# Altium footprint library digital.PcbLib: 46 footprints (part 2 of 3)
Each footprint in its own frame and in the unit in brackets; x right, y up, seen from the top. Pads: shape width x height; smd on the part's side, far side on the other; paste and mask are expansions set on the pad; w line width, h text height; cw(c..) or ccw(c..) is an arc to the next point about the centre after c.
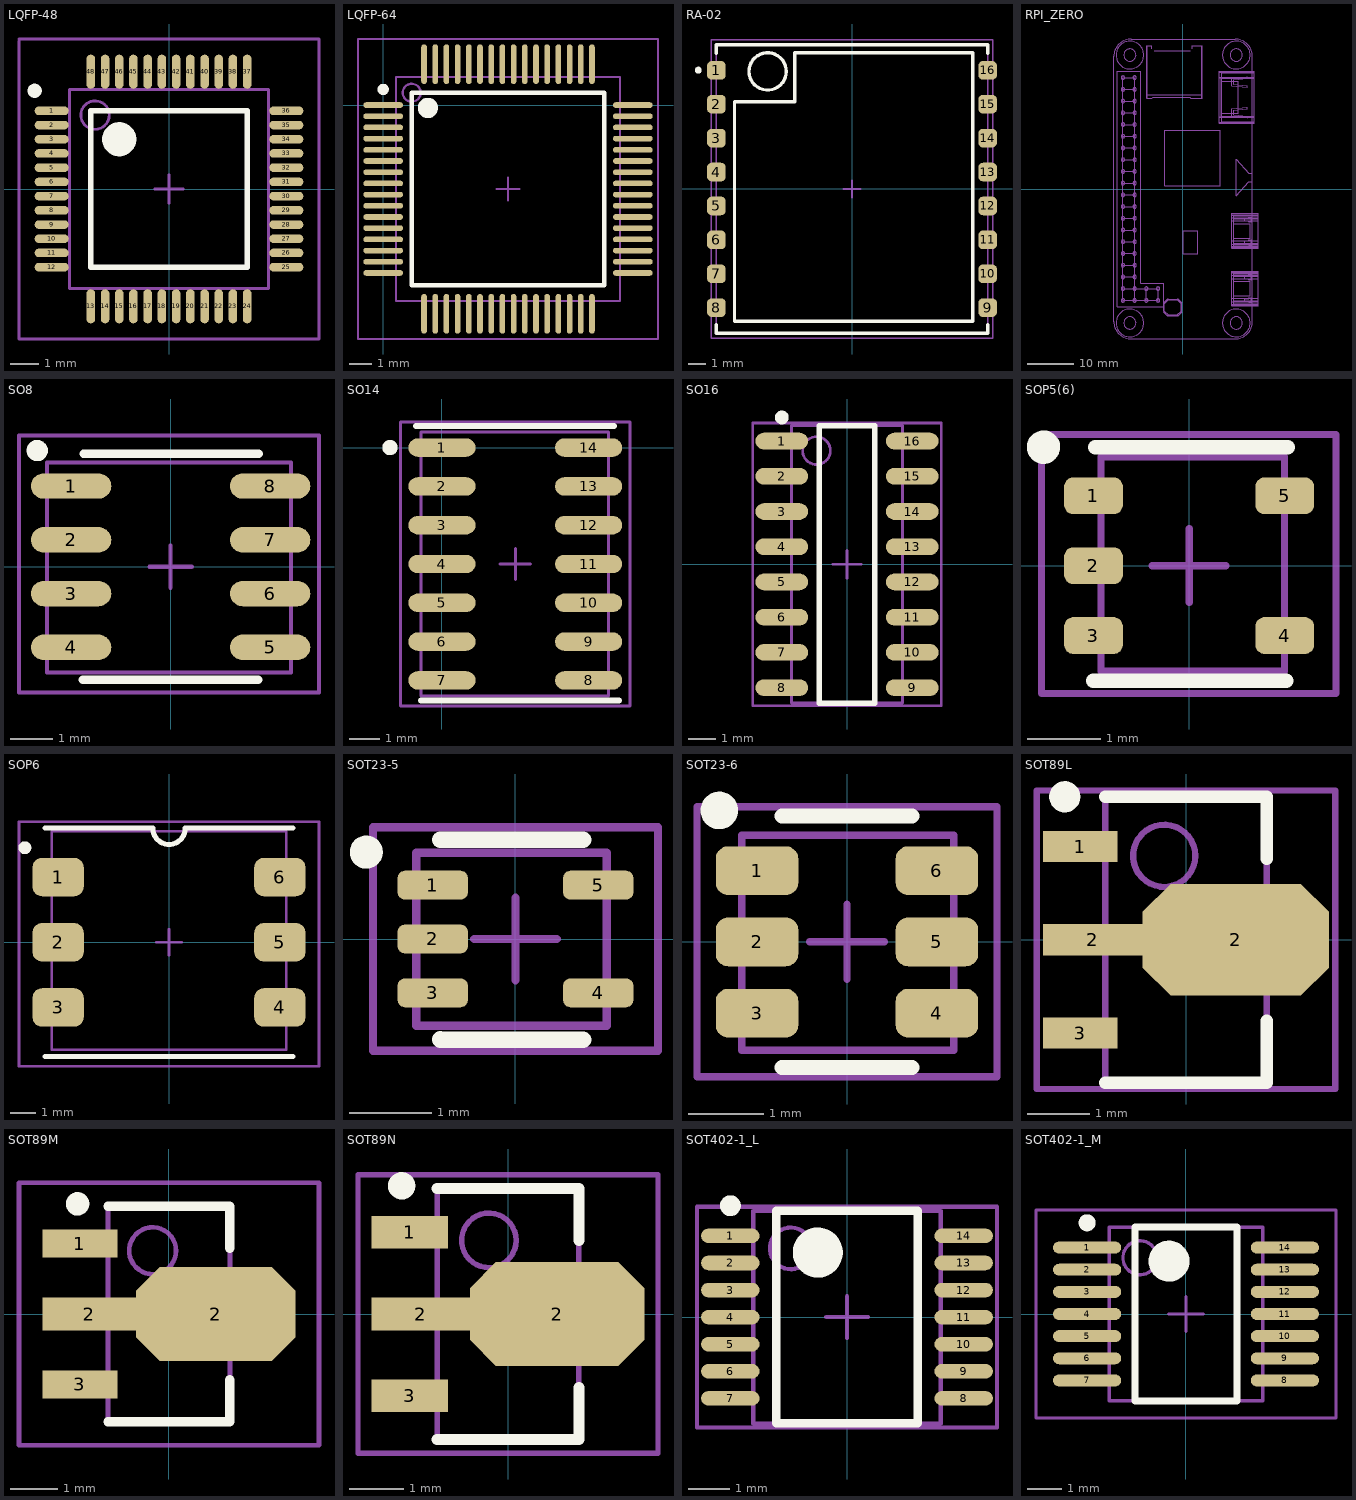
[diagram p1: the footprints below, top view; thin cyan lines are the x and y axes]

## LQFP-48 [mm] "Thin QFP, 48-Leads, Body 7x7mm, Pitch 0.5mm, IPC Medium Density"
height 1.6
pads (48):
  oval 1.2x0.3 smd: 1(-4.126,2.75) 2(-4.126,2.25) 3(-4.126,1.75) 4(-4.126,1.25) 5(-4.126,0.75) 6(-4.126,0.25) 7(-4.126,-0.25) 8(-4.126,-0.75) 9(-4.126,-1.25) 10(-4.126,-1.75) 11(-4.126,-2.25) 12(-4.126,-2.75) 25(4.126,-2.75) 26(4.126,-2.25) 27(4.126,-1.75) 28(4.126,-1.25) 29(4.126,-0.75) 30(4.126,-0.25) 31(4.126,0.25) 32(4.126,0.75) 33(4.126,1.25) 34(4.126,1.75) 35(4.126,2.25) 36(4.126,2.75)
  oval 0.3x1.2 smd: 13(-2.75,-4.126) 14(-2.25,-4.126) 15(-1.75,-4.126) 16(-1.25,-4.126) 17(-0.75,-4.126) 18(-0.25,-4.126) 19(0.25,-4.126) 20(0.75,-4.126) 21(1.25,-4.126) 22(1.75,-4.126) 23(2.25,-4.126) 24(2.75,-4.126) 37(2.75,4.126) 38(2.25,4.126) 39(1.75,4.126) 40(1.25,4.126) 41(0.75,4.126) 42(0.25,4.126) 43(-0.25,4.126) 44(-0.75,4.126) 45(-1.25,4.126) 46(-1.75,4.126) 47(-2.25,4.126) 48(-2.75,4.126)
Top Overlay:
  circle w0.25: c-4.724,3.454 r0.125
  circle w0.6: c-1.75,1.75 r0.3
  lines w0.2: -2.75,-2.75 -2.75,2.75 2.75,2.75 2.75,-2.75 -2.75,-2.75
Mechanical 13:
  circle w0.1: c-2.6,2.6 r0.5
  lines w0.1: -3.5,-3.5 -3.5,3.5 3.5,3.5 3.5,-3.5 -3.5,-3.5
  text ".Designator" at -1.753,4.089 h0.5
  text ".Value" at -1.016,-0.178 h0.5
Mechanical 15:
  lines w0.1: -5.276,5.2 -5.276,-5.276 5.276,-5.276 5.276,5.276 -5.276,5.276 ; -0.5,0 0.5,0 ; 0,-0.5 0,0.5
3D body "User Library-LQFP48_Grid_0_5.STEP": height 1.6, standoff 0, extent -4.5,-4.5 4.5,4.5

## LQFP-64 [mm] "64-Pin LQFP 0.5 mm Pitch"
height 1.6
pads (64):
  oval 1.778x0.25 smd mask+0.076: 1(0,0) 2(0,-0.5) 3(0,-1) 4(0,-1.5) 5(0,-2) 6(0,-2.5) 7(0,-3) 8(0,-3.5) 9(0,-4) 10(0,-4.5) 11(0,-5) 12(0,-5.5) 13(0,-6) 14(0,-6.5) 15(0,-7) 16(0,-7.5) 33(11.15,-7.5) 34(11.15,-7) 35(11.15,-6.5) 36(11.15,-6) 37(11.15,-5.5) 38(11.15,-5) 39(11.15,-4.5) 40(11.15,-4) 41(11.15,-3.5) 42(11.15,-3) 43(11.15,-2.5) 44(11.15,-2) 45(11.15,-1.5) 46(11.15,-1) 47(11.15,-0.5) 48(11.15,0)
  oval 0.25x1.778 smd mask+0.076: 17(1.825,-9.325) 18(2.325,-9.325) 19(2.825,-9.325) 20(3.325,-9.325) 21(3.825,-9.325) 22(4.325,-9.325) 23(4.825,-9.325) 24(5.325,-9.325) 25(5.825,-9.325) 26(6.325,-9.325) 27(6.825,-9.325) 28(7.325,-9.325) 29(7.825,-9.325) 30(8.325,-9.325) 31(8.825,-9.325) 32(9.325,-9.325) 49(9.325,1.825) 50(8.825,1.825) 51(8.325,1.825) 52(7.825,1.825) 53(7.325,1.825) 54(6.825,1.825) 55(6.325,1.825) 56(5.825,1.825) 57(5.325,1.825) 58(4.825,1.825) 59(4.325,1.825) 60(3.825,1.825) 61(3.325,1.825) 62(2.825,1.825) 63(2.325,1.825) 64(1.825,1.825)
Top Overlay:
  circle w0.6: c1.995,-0.13 r0.15
  circle w0.25: c0,0.7 r0.125
  lines w0.2: 1.275,-8.05 9.875,-8.05 9.875,0.55 1.275,0.55 1.275,-8.05
Mechanical 13:
  circle w0.1: c1.275,0.55 r0.4
  lines w0.1: 0.575,-8.75 10.575,-8.75 10.575,1.25 0.575,1.25 0.575,-8.75
  text ".Value" at 4.597,-4.039 h0.5
  text ".Designator" at 3.734,1.6 h0.5
Mechanical 15:
  lines w0.1: 5.075,-3.75 6.075,-3.75 ; 5.575,-4.25 5.575,-3.25 ; -1.125,-10.45 12.275,-10.45 12.275,2.95 -1.125,2.95 -1.125,-10.45
3D body "User Library-lqpf64.step": height 1.5, standoff 0.02, extent -0.425,-9.75 11.575,2.25

## RA-02 [mm]
height 4
pads (16):
  rrect50% 1.1x1.1 smd: 1(-8,7) 2(-8,5) 3(-8,3) 4(-8,1) 5(-8,-1) 6(-8,-3) 7(-8,-5) 8(-8,-7) 9(8,-7) 10(8,-5) 11(8,-3) 12(8,-1) 13(8,1) 14(8,3) 15(8,5) 16(8,7)
Top Overlay:
  circle w0.254: c-9.068,7.01 r0.076
  circle w0.2: c-4.978,6.934 r1.1
  lines w0.2: -8.001,-8.001 -8.001,-8.509 8.001,-8.509 8.001,-8.001 ; -8.001,8.001 -8.001,8.509 8.001,8.509 8.001,8.001 ; -6.934,-7.798 7.112,-7.798 7.112,8.026 -3.378,8.026 -3.378,5.156 -6.934,5.156 -6.934,-7.798
Mechanical 13:
  circle w0.1: c-4.978,6.934 r1.1
  lines w0.1: -8,-8.5 8,-8.5 8,8.5 -8,8.5 -8,-8.5 ; -6.934,-7.798 -6.934,5.156 -3.378,5.156 -3.378,8.026 7.112,8.026 7.112,-7.798 -6.934,-7.798
  text ".Designator" at -7.592,8.871 h0.5
  text ".Value" at -0.965,-0.178 h0.5
Mechanical 15:
  lines w0.1: -0.5,0 0.5,0 ; 0,-0.5 0,0.5 ; -8.3,-8.8 8.3,-8.8 8.3,8.8 -8.3,8.8 -8.3,-8.8
3D body "User Library-RA-02.step": height -0.5, standoff -3.7, extent -8,-8.5 8,8.5

## RPI_ZERO [mm]
height 6
Mechanical 1:
  drawing of 375 lines, arcs and shapes, not listed
3D body "raspberry_pi_zero.STEP": height 14.1, standoff 2.5, extent -14.973,-32.474 15.652,32.525

## SO8 [mm]
pads (8):
  oval 1.9x0.6 smd: 1(-2.35,1.905) 2(-2.35,0.635) 3(-2.35,-0.635) 4(-2.35,-1.905) 5(2.35,-1.905) 6(2.35,-0.635) 7(2.35,0.635) 8(2.35,1.905)
Top Overlay:
  circle w0.25: c-3.15,2.743 r0.125
  lines w0.2: -2.07,-2.667 2.07,-2.667 ; -2.057,2.667 2.083,2.667
Mechanical 13:
  lines w0.1: -2.921,-2.5 2.845,-2.5 2.845,2.464 -2.921,2.464 -2.921,-2.5
  text ".Value" at -1.041,-0.229 h0.5
  text ".Designator" at -1.829,2.972 h0.5
Mechanical 15:
  lines w0.1: -0.5,0 0.5,0 ; 0,-0.5 0,0.5 ; -3.581,-2.972 3.505,-2.972 3.505,3.099 -3.581,3.099 -3.581,-2.972
3D body "CircuitWorks-SO-8.step": height 1.45, standoff 0, extent -2.908,-2.451 2.87,2.451

## SO14 [mm] "14-Pin Small Outline Integrated Circuit 1.27 mm Pitch, IPC Medium Density"
height 1.75
pads (14):
  oval 2.2x0.6 smd: 1(0,0) 2(0,-1.27) 3(0,-2.54) 4(0,-3.81) 5(0,-5.08) 6(0,-6.35) 7(0,-7.62) 8(4.8,-7.62) 9(4.8,-6.35) 10(4.8,-5.08) 11(4.8,-3.81) 12(4.8,-2.54) 13(4.8,-1.27) 14(4.8,0)
Top Overlay:
  circle w0.25: c-1.702,0 r0.125
  lines w0.2: -0.851,0.711 5.626,0.711 ; -0.686,-8.28 5.791,-8.28
Mechanical 13:
  lines w0.1: -0.681,-8.135 5.456,-8.135 5.456,0.515 -0.681,0.515 -0.681,-8.135
  text ".Designator" at 0.66,0.914 h0.5
  text ".Value" at 1.5,-3.962 h0.5
Mechanical 15:
  lines w0.1: 1.9,-3.81 2.9,-3.81 ; 2.4,-4.31 2.4,-3.31 ; -1.35,-8.46 6.15,-8.46 6.15,0.84 -1.35,0.84 -1.35,-8.46
3D body "User Library-so14-2.step": height 1.78, standoff 0.01, extent -0.681,-8.16 5.456,0.54

## SO16 [mm] "SOIC, 16-Leads, Body 9.9x3.9mm, Pitch 1.27mm, IPC High Density"
height 1.75
pads (16):
  oval 1.9x0.6 smd: 1(-2.35,4.445) 2(-2.35,3.175) 3(-2.35,1.905) 4(-2.35,0.635) 5(-2.35,-0.635) 6(-2.35,-1.905) 7(-2.35,-3.175) 8(-2.35,-4.445) 9(2.35,-4.445) 10(2.35,-3.175) 11(2.35,-1.905) 12(2.35,-0.635) 13(2.35,0.635) 14(2.35,1.905) 15(2.35,3.175) 16(2.35,4.445)
Top Overlay:
  circle w0.25: c-2.35,5.295 r0.125
  lines w0.2: -1,-5 -1,5 1,5 1,-5 -1,-5
Mechanical 13:
  circle w0.1: c-1.1,4.1 r0.5
  lines w0.1: -2,-5 -2,5 2,5 2,-5 -2,-5
  text ".Value" at -0.965,-0.203 h0.5
  text ".Designator" at -1.829,5.232 h0.5
Mechanical 15:
  lines w0.1: -0.5,0 0.5,0 ; 0,-0.5 0,0.5 ; -3.4,-5.1 -3.4,5.1 3.4,5.1 3.4,-5.1 -3.4,-5.1
3D body: height 1.75, standoff 0, extent -2,-5 2,5

## SOP5(6) [mm] "Small Outline; 6 Leads (1 Absent); Body Width 4.4 mm; Pitch 1.27 mm"
height 2.4
pads (5):
  rrect50% 0.8x0.5 smd mask+0.076: 1(-1.3,0.95) 2(-1.3,0) 3(-1.3,-0.95) 4(1.3,-0.95) 5(1.3,0.95)
Top Overlay:
  lines w0.2: -1.3,-1.565 1.316,-1.565 ; -1.275,1.61 1.342,1.61
  lines w0.25: -1.88,1.626 ccw(c-1.98,1.611) -1.879,1.611
Mechanical 13:
  lines w0.1: -1.198,-1.438 1.296,-1.438 1.296,1.483 -1.198,1.483 -1.198,-1.438
  text ".Value" at -0.889,-0.152 h0.5
  text ".Designator" at -1.778,1.803 h0.5
Mechanical 15:
  lines w0.1: -0.5,0 0.5,0 ; 0,-0.5 0,0.5 ; -2.006,-1.738 -2.006,1.783 1.997,1.783 1.997,-1.738 -2.006,-1.738
3D body "CircuitWorks-SOT-23-5.step": height 1.11, standoff 0.01, extent -1.204,-1.515 1.296,1.485

## SOP6 [mm] "Small Outline; 6 Leads; Body Width 4.4 mm; Pitch 1.27 mm"
height 2.4
pads (6):
  rrect50% 2x1.5 smd: 1(-4.318,2.54) 2(-4.318,0) 3(-4.318,-2.54) 4(4.318,-2.54) 5(4.318,0) 6(4.318,2.54)
Top Overlay:
  circle w0.25: c-5.613,3.683 r0.125
  lines w0.2: -4.826,-4.445 4.826,-4.445 ; -4.826,4.445 -0.635,4.445 ccw(c0,4.445) 0.635,4.445 4.826,4.445
Mechanical 13:
  lines w0.1: -4.572,-4.191 -4.572,4.318 4.572,4.318 4.572,-4.191 -4.572,-4.191
  text ".Designator" at -4.572,4.75 h0.5
  text ".Value" at -0.94,-0.279 h0.5
Mechanical 15:
  lines w0.1: -0.5,0 0.5,0 ; 0,-0.5 0,0.5 ; -5.842,-4.826 5.842,-4.826 5.842,4.699 -5.842,4.699 -5.842,-4.826
3D body "User Library-SOP-6.step": height 4, standoff -0.08, extent -4.582,-4.192 4.582,4.318

## SOT23-5 [mm] "SOT23, 6-Leads, Body 2.9x1.6mm, Pitch 0.95mm, Lead Span 2.7mm, IPC Medium Density"
height 1.45
pads (5):
  rrect50% 0.85x0.35 smd: 1(-1,0.65) 2(-1,0) 3(-1,-0.65) 4(1,-0.65) 5(1,0.65)
Top Overlay:
  circle w0.2: c-1.803,1.05 r0.1
  lines w0.2: -0.911,-1.214 0.816,-1.215 ; -0.911,1.199 0.816,1.198
Mechanical 13:
  lines w0.1: -1.198,-1.05 -1.198,1.041 1.102,1.041 1.102,-1.05 -1.198,-1.05
  text ".Value" at -0.991,-0.178 h0.5
  text ".Designator" at -1.722,1.35 h0.5
Mechanical 15:
  lines w0.1: -0.5,0 0.5,0 ; 0,-0.5 0,0.5 ; -1.722,-1.35 -1.722,1.35 1.722,1.35 1.722,-1.35 -1.722,-1.35
3D body "User Library-sot353.step": height 1, standoff 0, extent -1.198,-1.05 1.102,1.05

## SOT23-6 [mm] "SOT23, 6-Leads, Body 2.9x1.6mm, Pitch 0.95mm, Lead Span 2.7mm, IPC Medium Density"
height 1.45
pads (6):
  rrect50% 1.1x0.65 smd: 1(-1.2,0.95) 2(-1.2,0) 3(-1.2,-0.95) 4(1.2,-0.95) 5(1.2,0) 6(1.2,0.95)
Top Overlay:
  circle w0.25: c-1.702,1.753 r0.125
  lines w0.2: -0.864,-1.676 0.864,-1.676 ; -0.864,1.677 0.864,1.676
Mechanical 13:
  lines w0.1: -1.4,-1.448 -1.4,1.424 1.422,1.424 1.422,-1.448 -1.4,-1.448
  text ".Value" at -0.889,-0.229 h0.5
  text ".Designator" at -1.753,1.803 h0.5
Mechanical 15:
  lines w0.1: -0.5,0 0.5,0 ; 0,-0.5 0,0.5 ; -2,-1.8 -2,1.8 2,1.8 2,-1.8 -2,-1.8
3D body "User Library-SOT23-6-2.step": height 1.45, standoff 0, extent -1.4,-1.476 1.4,1.424

## SOT89L [mm] "SOT89, 3-Leads, Body 4.5x2.4 mm, Pitch 1.5mm, Lead Span 4.1mm, IPC High Density"
height 1.6
pads (4):
  rect 1.2x0.5 smd: 1(-1.7,1.5) 3(-1.7,-1.5)
  rect 1.6x0.5 smd: 2(-1.5,0)
  oct 3x1.8 smd: 2(0.8,0)
Top Overlay:
  circle w0.25: c-1.95,2.3 r0.125
  lines w0.2: -1.3,-2.3 1.3,-2.3 1.3,-1.3 ; -1.3,2.3 1.3,2.3 1.3,1.3
Mechanical 13:
  circle w0.1: c-0.35,1.35 r0.5
  lines w0.1: -1.3,-2.3 -1.3,2.3 1.3,2.3 1.3,-2.3 -1.3,-2.3
Mechanical 15:
  lines w0.1: -0.5,0 0.5,0 ; 0,-0.5 0,0.5 ; -2.4,-2.4 -2.4,2.4 2.4,2.4 2.4,-2.4 -2.4,-2.4
3D body: height 1.6, standoff 0, extent -1.3,-2.3 1.3,2.3

## SOT89M [mm] "SOT89, 3-Leads, Body 4.5x2.4 mm, Pitch 1.5mm, Lead Span 4.1mm, IPC Low Density"
height 1.6
pads (4):
  rect 1.6x0.6 smd: 1(-1.9,1.5) 3(-1.9,-1.5)
  rect 2x0.7 smd: 2(-1.7,0)
  oct 3.4x2 smd: 2(1,0)
Top Overlay:
  circle w0.25: c-1.95,2.35 r0.125
  lines w0.2: -1.3,-2.3 1.3,-2.3 1.3,-1.4 ; -1.3,2.3 1.3,2.3 1.3,1.4
Mechanical 13:
  circle w0.1: c-0.35,1.35 r0.5
  lines w0.1: -1.3,-2.3 1.3,-2.3 1.3,2.3 -1.3,2.3 -1.3,-2.3
Mechanical 15:
  lines w0.1: -0.5,0 0.5,0 ; 0,-0.5 0,0.5 ; -3.2,-2.8 3.2,-2.8 3.2,2.8 -3.2,2.8 -3.2,-2.8
3D body: height 1.6, standoff 0, extent -1.3,-2.3 1.3,2.3

## SOT89N [mm] "SOT89, 3-Leads, Body 4.5x2.4 mm, Pitch 1.5mm, Lead Span 4.1mm, IPC Medium Density"
height 1.6
pads (4):
  rect 1.4x0.6 smd: 1(-1.8,1.5) 3(-1.8,-1.5)
  rect 1.8x0.6 smd: 2(-1.6,0)
  oct 3.2x1.9 smd: 2(0.9,0)
Top Overlay:
  circle w0.25: c-1.95,2.35 r0.125
  lines w0.2: -1.3,-2.3 1.3,-2.3 1.3,-1.35 ; -1.3,2.3 1.3,2.3 1.3,1.35
Mechanical 13:
  circle w0.1: c-0.35,1.35 r0.5
  lines w0.1: -1.3,-2.3 -1.3,2.3 1.3,2.3 1.3,-2.3 -1.3,-2.3
Mechanical 15:
  lines w0.1: -0.5,0 0.5,0 ; 0,-0.5 0,0.5 ; -2.75,-2.55 -2.75,2.55 2.75,2.55 2.75,-2.55 -2.75,-2.55
3D body: height 1.6, standoff 0, extent -1.3,-2.3 1.3,2.3

## SOT402-1_L [mm] "TSOP, 14-Leads, Body 5x4.4mm, Pitch 0.65mm, IPC High Density"
height 1.1
pads (14):
  oval 1.4x0.35 smd: 1(-2.8,1.95) 2(-2.8,1.3) 3(-2.8,0.65) 4(-2.8,0) 5(-2.8,-0.65) 6(-2.8,-1.3) 7(-2.8,-1.95) 8(2.8,-1.95) 9(2.8,-1.3) 10(2.8,-0.65) 11(2.8,0) 12(2.8,0.65) 13(2.8,1.3) 14(2.8,1.95)
Top Overlay:
  circle w0.25: c-2.8,2.675 r0.125
  circle w0.6: c-0.7,1.55 r0.3
  lines w0.2: -1.7,-2.55 -1.7,2.55 1.7,2.55 1.7,-2.55 -1.7,-2.55
Mechanical 13:
  circle w0.1: c-1.35,1.65 r0.5
  lines w0.1: -2.25,-2.55 -2.25,2.55 2.25,2.55 2.25,-2.55 -2.25,-2.55
Mechanical 15:
  lines w0.1: -0.5,0 0.5,0 ; 0,-0.5 0,0.5 ; -3.6,-2.65 -3.6,2.65 3.6,2.65 3.6,-2.65 -3.6,-2.65
3D body: height 1.1, standoff 0, extent -2.25,-2.55 2.25,2.55

## SOT402-1_M [mm] "TSOP, 14-Leads, Body 5x4.4mm, Pitch 0.65mm, IPC Low Density"
height 1.1
pads (14):
  oval 2x0.35 smd: 1(-2.9,1.95) 2(-2.9,1.3) 3(-2.9,0.65) 4(-2.9,0) 5(-2.9,-0.65) 6(-2.9,-1.3) 7(-2.9,-1.95) 8(2.9,-1.95) 9(2.9,-1.3) 10(2.9,-0.65) 11(2.9,0) 12(2.9,0.65) 13(2.9,1.3) 14(2.9,1.95)
Top Overlay:
  circle w0.6: c-0.5,1.55 r0.3
  circle w0.25: c-2.9,2.675 r0.125
  lines w0.2: -1.5,-2.55 1.5,-2.55 1.5,2.55 -1.5,2.55 -1.5,-2.55
Mechanical 13:
  circle w0.1: c-1.35,1.65 r0.5
  lines w0.1: -2.25,-2.55 2.25,-2.55 2.25,2.55 -2.25,2.55 -2.25,-2.55
Mechanical 15:
  lines w0.1: -0.5,0 0.5,0 ; 0,-0.5 0,0.5 ; -4.4,-3.05 4.4,-3.05 4.4,3.05 -4.4,3.05 -4.4,-3.05
3D body: height 1.1, standoff 0, extent -2.25,-2.55 2.25,2.55